# Altium footprint library Passive.PcbLib: 6 footprints
Each footprint in its own frame and in the unit in brackets; x right, y up, seen from the top. Pads: shape width x height; smd on the part's side, far side on the other; paste and mask are expansions set on the pad; w line width, h text height; cw(c..) or ccw(c..) is an arc to the next point about the centre after c.
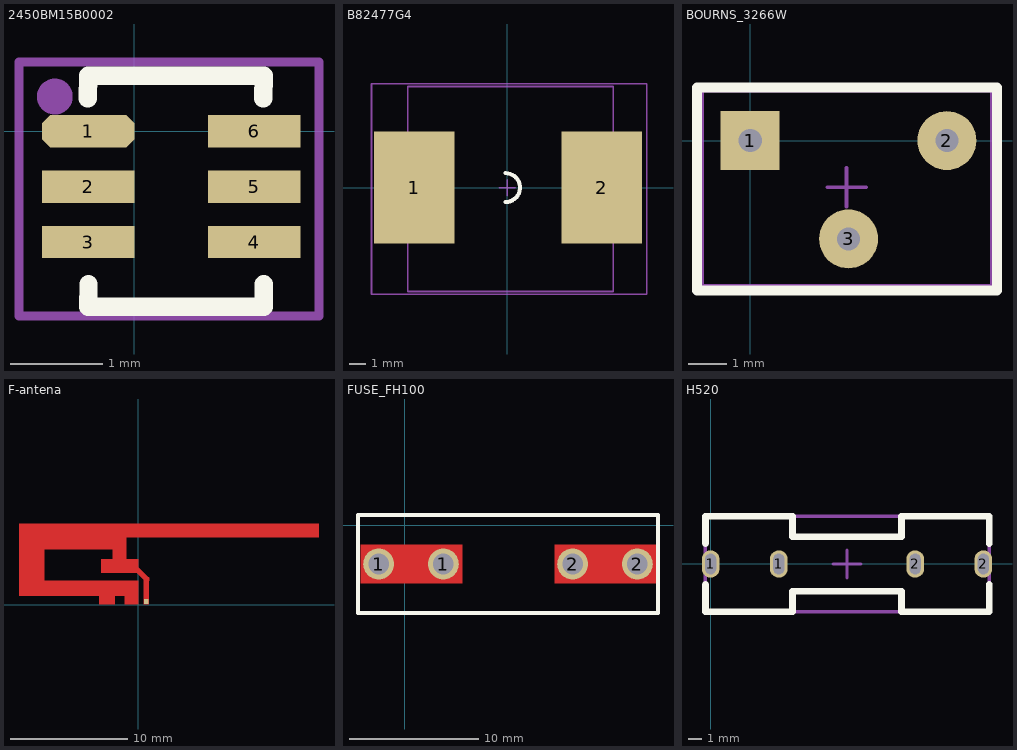
[diagram p0: the footprints below, top view; thin cyan lines are the x and y axes]

## 2450BM15B0002 [mm]
pads (6):
  oct 1x0.35 smd: 1(-0.5,0)
  rect 1x0.35 smd: 2(-0.5,-0.6) 3(-0.5,-1.2) 4(1.3,-1.2) 5(1.3,-0.6) 6(1.3,0)
Top Overlay:
  lines w0.2: -0.503,0.356 -0.5,0.6 1.4,0.6 1.397,0.356 ; -0.497,-1.656 -0.5,-1.9 1.4,-1.9 1.403,-1.656
Mechanical 29:
  circle w0.254: c-0.862,0.376 r0.067
  lines w0.1: -1.25,-2 -1.25,0.75 2,0.75 2,-2 -1.25,-2
  text ".Designator" at -1,-0.75 h1
3D body "Balun 2450BM15.STEP": height 0.7, standoff 0, extent -0.193,-1.61 1.057,0.39

## B82477G4 [mm]
pads (2):
  rect 5x7 smd: 1(-5.8,0) 2(5.9,0)
Top Overlay:
  lines w0.254: -0.1,-0.9 ccw(c-0.1,0) -0.1,0.9
Mechanical 13:
  lines w0.1: -6.198,-6.477 -6.198,6.299 6.604,6.299 6.604,-6.477 -6.198,-6.477
Mechanical 15:
  lines w0.1: -0.5,0 0.5,0 ; 0,-0.5 0,0.5 ; -8.458,-6.655 8.687,-6.655 8.687,6.477 -8.458,6.477 -8.458,-6.655
3D body "b82477g4.step": height 8, standoff 0, extent -6.2,-6.5 6.6,6.3

## BOURNS_3266W [mil]
pads (3):
  rect 60x60 hole 23.62: 1(0,0)
  round 60 hole 23.62: 2(200,0) 3(100,-100)
Top Overlay:
  lines w10: -54.13,-152.56 -54.13,54 250.98,54 250.98,-152.56 -54.13,-152.56
Mechanical 15:
  lines w3.94: 78.32,-47.45 117.69,-47.45 ; 98.01,-67.13 98.01,-27.76
  lines w7.87: -51,-150 -51,53 248,53 248,-150 -51,-150
3D body "BOURNS-POT-3266W.step": height 325, standoff -75, extent -35,-137 229,40

## F-antena [mm] "2.4 Ghz fow zigbee"
pads (1):
  rect 0.4x0.4 smd: 0(0.675,0.25)
Top Layer:
  rectangle: 0.45,0 0.91,2.1
  rectangle: -3.35,0 -2,0.74
  rectangle: -1.2,0 0,0.74
  rectangle: -3.2,2.69 0,3.9
  rectangle: -8,0.74 0,2.03
  rectangle: -10.18,0.74 -8,5.7
  rectangle: -10.18,5.7 15.4,6.91
  rectangle: -2.2,3.9 -1,5.7
  rectangle: -8,4.7 -2.2,5.7
  region: -0.037,3.238 -0.362,2.913 0.45,2.1 0.775,2.425
  region: 0.45,2.03 0.45,2.1 0.775,2.425 0.91,2.291 0.91,2.03

## FUSE_FH100 [mm]
pads (4):
  round 2.4 hole 1.6: 1(-2,-3) 1(3,-3) 2(13,-3) 2(18,-3)
Top Layer:
  rectangle: 11.6,-4.5 19.5,-1.5
  rectangle: -3.4,-4.5 4.5,-1.5
Top Overlay:
  lines w0.3: -3.6,-6.8 -3.6,0.8 19.6,0.8 19.6,-6.8 -3.6,-6.8
3D body "FH-100 with fuse 5x20.STEP": height 9.99, standoff -3.5, extent -2.4,-6.5 18.4,0.5

## H520 [mm]
height 10
pads (4):
  oval 1.3x2 hole 0.8 slot 1.5 at 90 deg: 1(0,0) 1(5,0) 2(15,0) 2(20,0)
Top Overlay:
  lines w0.5: -0.381,-1.5 -0.381,-3.5 6,-3.5 6,-2 14,-2 14,-3.5 20.419,-3.5 ; -0.381,1.5 -0.381,3.5 6,3.5 6,2 14,2 14,3.5 20.419,3.5 ; 20.432,-3.5 20.432,-1.5 ; 20.432,1.5 20.432,3.5
Mechanical 15:
  lines w0.25: 9,0 11,0 ; 10,-1 10,1 ; -0.381,-3.5 20.432,-3.5 20.432,3.5 -0.381,3.5 -0.381,-3.5
3D body "FH-100 with fuse 5x20.STEP": height 10.49, standoff -3, extent -0.381,-3.5 20.419,3.5